# Altium footprint library hphonglib.PcbLib: 703 footprints (part 14 of 44)
Each footprint in its own frame and in the unit in brackets; x right, y up, seen from the top. Pads: shape width x height; smd on the part's side, far side on the other; paste and mask are expansions set on the pad; w line width, h text height; cw(c..) or ccw(c..) is an arc to the next point about the centre after c.
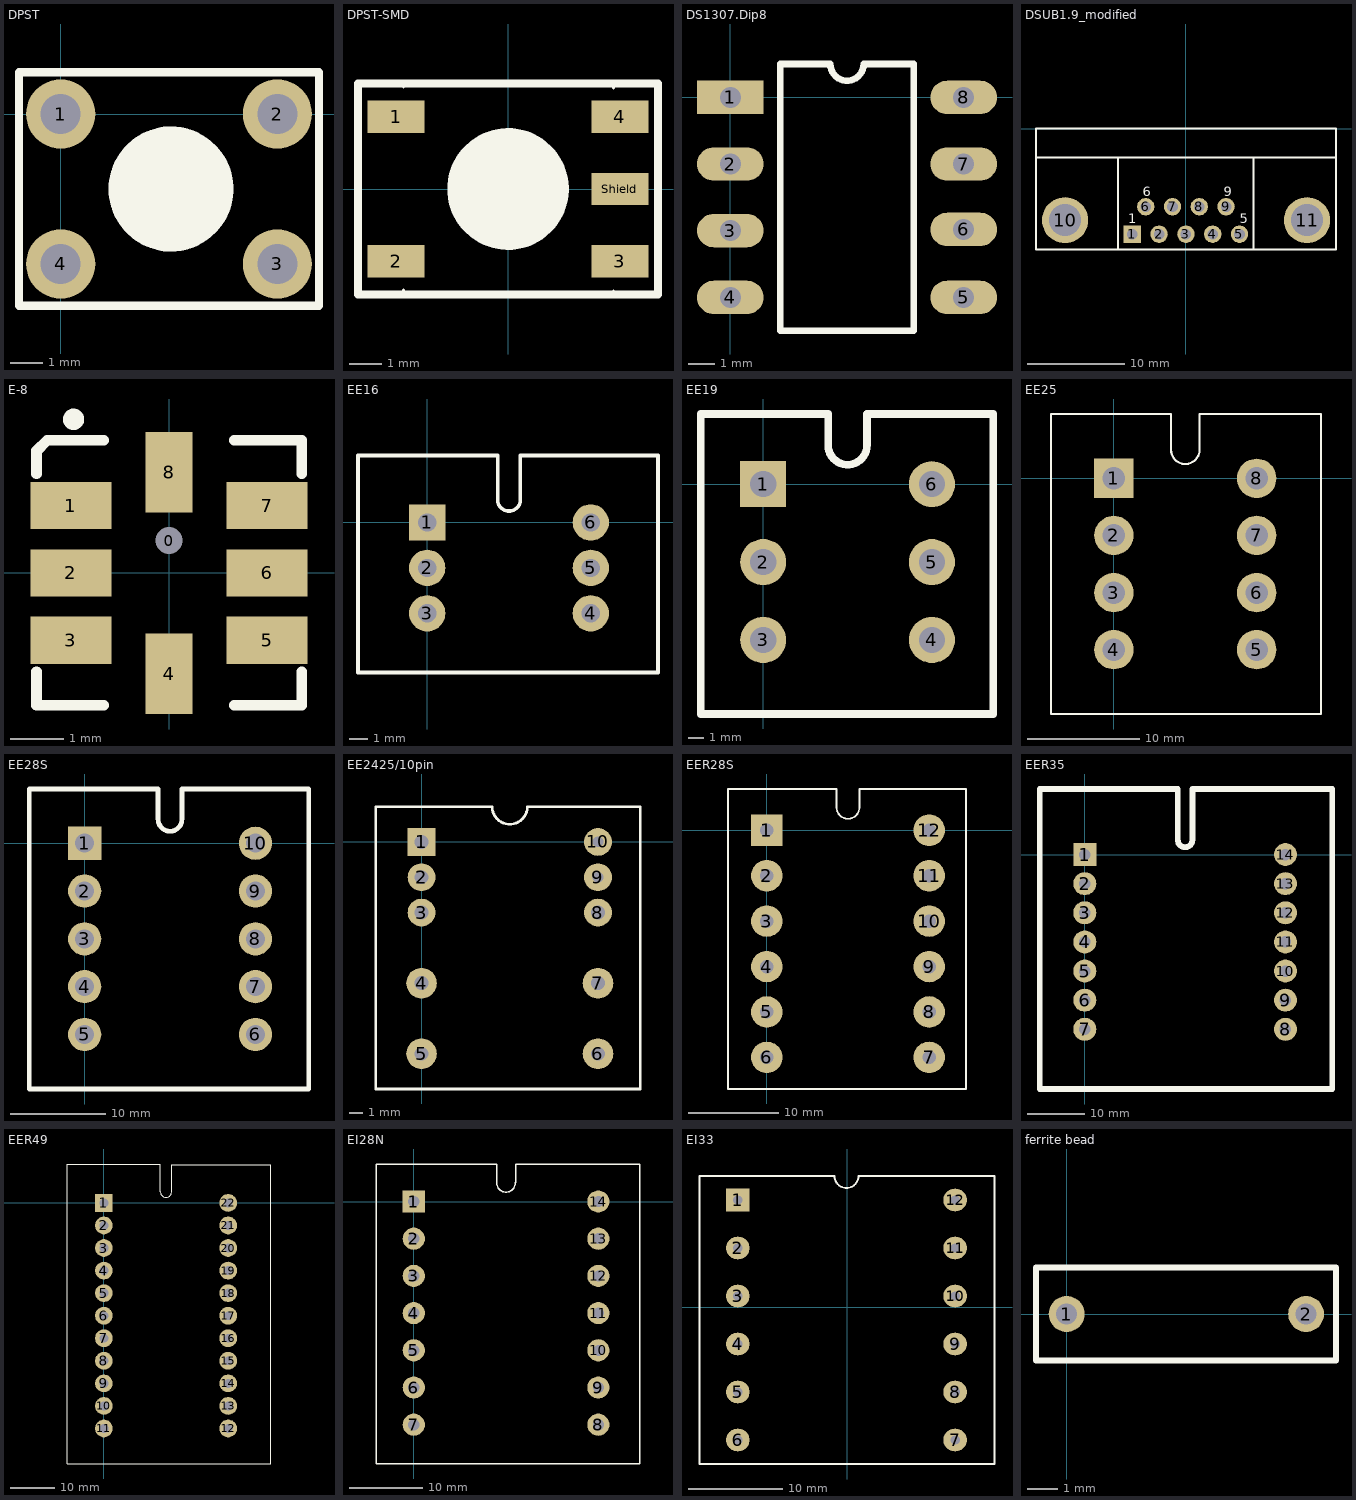
[diagram p13: the footprints below, top view; thin cyan lines are the x and y axes]

## DPST [mil] "Double-Pole, Single-Throw Switch; 4 Leads; Solder Pad 35mil"
pads (4):
  round 83 hole 48: 1(0,0) 2(260,0) 3(260,-180) 4(0,-180)
Top Overlay:
  circle w80: c132.5,-90 r35
  lines w10: -50,-230 310,-230 310,50 -50,50 -50,-230
3D body: height 275.59, standoff -137.8, extent -25.51,-212.04 285.52,32.06

## DPST-SMD [mil] "Double-Pole, Single-Throw Switch; 4 Leads; Solder Pad 35mil"
pads (5):
  rect 70x40 smd: 1(-138,89) 2(-138,-89) 3(138,-89) 4(138,89) Shield(138,0)
Top Overlay:
  circle w80: c0,0 r35
  lines w4: -129,-130 -129,-125 ; -129,126 -129,130 ; 130,-130 130,-126 ; 130,125 130,130
  lines w10: -185,-130 185,-130 185,130 -185,130 -185,-130
3D body: height 122.05, standoff 78.74, extent -59.32,-59.32 59.32,59.32
3D body: height 82.68, standoff 39.37, extent -135,-42 -122,41
3D body: height 23.62, standoff 15.75, extent -137,-104 -122,-73
3D body: height 23.62, standoff 0, extent -145,-104 -137,-73
3D body: height 7.87, standoff 0, extent -167,-104 -145,-73
3D body: height 23.62, standoff 15.75, extent -137,73 -122,104
3D body: height 23.62, standoff 0, extent -145,73 -137,104
3D body: height 7.87, standoff 0, extent -167,73 -145,104
3D body: height 23.62, standoff 15.75, extent 122,73 137,104
3D body: height 23.62, standoff 0, extent 137,73 145,104
3D body: height 7.87, standoff 0, extent 145,73 167,104
3D body: height 7.87, standoff 0, extent 145,-104 167,-73
3D body: height 23.62, standoff 0, extent 137,-104 145,-73
3D body: height 23.62, standoff 15.75, extent 122,-104 137,-73
3D body: height 7.87, standoff 0, extent 135,13 137,23
3D body: height 7.87, standoff 0, extent 135,-23 137,-11
3D body: height 7.87, standoff 0, extent 135,-11 167,13
3D body: height 82.68, standoff 0, extent 122,-41 135,42
3D body: height 82.68, standoff 78.74, extent -130,-130 130,130
3D body: height 78.74, standoff 3.94, extent -129.98,-129.98 129.98,129.98

## DS1307.Dip8 [mm] "Dual Inline Package 8 pins"
pads (8):
  rect 2.54x1.27 hole 0.8: 1(0,0)
  oval 2.54x1.27 hole 0.8: 2(0,-2.54) 3(0,-5.08) 4(0,-7.62) 5(8.89,-7.62) 6(8.89,-5.03) 7(8.89,-2.54) 8(8.89,0)
Top Overlay:
  lines w0.254: 1.905,-8.89 1.905,1.27 3.81,1.27 ccw(c4.445,1.27) 5.08,1.27 6.985,1.27 6.985,-8.89 1.905,-8.89
3D body: height 3, standoff 0.5, extent 0.03,-8.37 0.38,-6.87
3D body: height 0.5, standoff -3.8, extent 0.03,-7.895 0.38,-7.345
3D body: height 0.5, standoff -3.8, extent 8.42,-0.275 8.77,0.275
3D body: height 3, standoff 0.5, extent 8.42,-0.75 8.77,0.75
3D body: height 3, standoff 2.65, extent 6.895,-0.75 8.595,0.75
3D body: height 0.5, standoff -3.8, extent 8.42,-2.815 8.77,-2.265
3D body: height 3, standoff 0.5, extent 8.42,-3.29 8.77,-1.79
3D body: height 3, standoff 2.65, extent 6.895,-3.29 8.595,-1.79
3D body: height 0.5, standoff -3.8, extent 8.42,-5.355 8.77,-4.805
3D body: height 3, standoff 0.5, extent 8.42,-5.83 8.77,-4.33
3D body: height 3, standoff 2.65, extent 6.895,-5.83 8.595,-4.33
3D body: height 0.5, standoff -3.8, extent 0.03,-5.355 0.38,-4.805
3D body: height 3, standoff 0.5, extent 0.03,-5.83 0.38,-4.33
3D body: height 3, standoff 2.65, extent 0.205,-5.83 1.905,-4.33
3D body: height 0.5, standoff -3.8, extent 0.03,-2.815 0.38,-2.265
3D body: height 3, standoff 0.5, extent 0.03,-3.29 0.38,-1.79
3D body: height 3, standoff 2.65, extent 0.205,-3.29 1.905,-1.79
3D body: height 0.5, standoff -3.8, extent 0.03,-0.275 0.38,0.275
3D body: height 3, standoff 0.5, extent 0.03,-0.75 0.38,0.75
3D body: height 3, standoff 2.65, extent 0.205,-0.75 1.905,0.75
3D body: height 5.3, standoff 0.3, extent 1.905,-8.89 6.985,1.27
3D body: height 3, standoff 2.65, extent 0.205,-8.37 1.905,-6.87
3D body: height 3, standoff 2.65, extent 6.895,-8.37 8.595,-6.87
3D body: height 5.4, standoff 4, extent 3.441,0.261 5.458,1.27

## DSUB1.9_modified [mm] "7906 Series DSUB Right Angle Socket; Body Width, 30.81mm, 9 Positions"
pads (11):
  rect 1.8x1.8 hole 1.1: 1(-5.54,-10.92)
  round 1.8 hole 1.1: 2(-2.77,-10.92) 3(0,-10.92) 4(2.77,-10.92) 5(5.54,-10.92) 6(-4.155,-8.08) 7(-1.385,-8.08) 8(1.385,-8.08) 9(4.155,-8.08)
  round 4.76 hole 3.3: 10(-12.497,-9.474) 11(12.522,-9.474)
Top Overlay:
  lines w0.2: -15.4,-3 15.4,-3 ; -7,-12.4 -7,-3 ; 7,-12.4 7,-3 ; -15.5,-12.5 15.5,-12.5 15.5,0 -15.5,0 -15.5,-12.5
  text "6" at -4.445,-6.985 h1
  text "9" at 3.937,-6.985 h1
  text "5" at 5.588,-9.779 h1
  text "1" at -5.969,-9.779 h1
Bottom Overlay:
  circle w0.254: c-12.495,-9.5 r2.659
  circle w0.254: c12.495,-9.5 r2.659
  lines w0.254: -7.036,-12.522 -7.036,-3.023 -7.01,-3.023 ; 6.985,-12.522 6.985,-3.023 7.036,-3.023 ; 15.519,-3.023 15.519,-12.522 -15.469,-12.522 -15.469,-3.023 ; -15.469,-3.023 15.494,-3.023 15.494,0.025 -15.469,0.025 -15.469,-3.023
  text "1" at -5.715,-9.855 h1
  text "9" at 4.547,-7.01 h1
  text "5" at 6.172,-9.804 h1
  text "6" at -3.708,-7.036 h1
Mechanical 13:
  text ".Designator" at -4.216,-9.627 h2.03
3D body: height 12.55, standoff -3.5, extent -15.672,-12.575 15.642,6.225

## E-8 [mil]
pads (9):
  round 15 hole 20 unplated: 0(-0.02,23.98)
  rect 60x35 smd: 1(-72.85,49.98) 2(-72.85,-0.02) 3(-72.85,-50.02) 5(72.82,-50.02) 6(72.82,-0.02) 7(72.82,49.98)
  rect 35x60 smd: 4(-0.02,-74.82) 8(-0.02,74.79)
Top Overlay:
  circle w7.87: c-70.89,114.16 r3.94
  lines w7.87: -98.44,-73.44 -98.44,-98.44 -48.44,-98.44 ; -98.44,73.56 -98.44,90.69 ; -90.57,98.56 -48.44,98.56 ; 48.56,-98.44 98.56,-98.44 98.56,-73.44 ; 48.56,98.56 98.56,98.56 98.56,73.56
  lines w8: -98.44,90.69 -90.57,98.56
3D body: height 80, standoff 0, extent -95,-95 95,95

## EE16 [mm]
pads (6):
  rect 2x2 hole 1: 1(0,0)
  round 2 hole 1: 2(0,-2.5) 3(0,-5) 4(9,-5) 5(9,-2.5) 6(9,0)
Top Overlay:
  lines w0.2: -3.81,-8.255 12.7,-8.255 12.7,3.683 5.125,3.683 5.125,1.25 cw(c4.5,1.25) 3.875,1.25 3.875,3.683 -3.81,3.683 -3.81,-8.255

## EE19 [mm] "EE19 ferrit core"
pads (6):
  rect 3x3 hole 1.7: 1(0,0)
  round 3 hole 1.7: 2(0,-5.08) 3(0,-10.16) 4(11,-10.16) 5(11,-5.08) 6(11,0)
Top Overlay:
  lines w0.5: -4.064,-14.986 14.986,-14.986 14.986,4.572 6.77,4.572 6.77,2.54 cw(c5.5,2.54) 4.23,2.54 4.23,4.572 -4.064,4.572 -4.064,-14.986

## EE25 [mm] "Ferrit core"
pads (8):
  rect 3.5x3.5 hole 2: 1(0,0)
  round 3.5 hole 2: 2(0,-5.08) 3(0,-10.16) 4(0,-15.24) 5(12.7,-15.24) 6(12.7,-10.16) 7(12.7,-5.08) 8(12.7,0)
Top Overlay:
  lines w0.2: -5.588,-20.955 -5.588,5.715 5.08,5.715 5.08,2.54 ccw(c6.35,2.54) 7.62,2.54 7.62,5.715 18.415,5.715 18.415,-20.955 -5.588,-20.955

## EE28S [mm]
pads (10):
  rect 3.5x3.5 hole 2: 1(0,0)
  round 3.5 hole 2: 2(0,-5.04) 3(0,-10.08) 4(0,-15.12) 5(0,-20.16) 6(18,-20.16) 7(18,-15.12) 8(18,-10.08) 9(18,-5.04) 10(18,0)
Top Overlay:
  lines w0.5: -5.842,-25.908 23.622,-25.908 23.622,5.715 10.26,5.715 10.26,2.52 cw(c9,2.52) 7.74,2.52 7.74,5.715 -5.842,5.715 -5.842,-25.908

## EE2425/10pin [mm]
pads (10):
  rect 2x2 hole 1: 1(0,0)
  round 2 hole 1: 2(0,-2.54) 3(0,-5.08) 8(12.7,-5.08)
  round 2.2 / inner oval 2.2x1.2 / far side round 2.2 hole 1: 4(0,-10.16) 5(0,-15.24) 6(12.7,-15.24) 7(12.7,-10.16)
  round 2 hole 0.762: 9(12.7,-2.54) 10(12.7,0)
Top Overlay:
  lines w0.2: -3.302,-17.78 15.748,-17.78 15.748,2.54 7.62,2.54 cw(c6.35,2.54) 5.08,2.54 -3.302,2.54 -3.302,-17.78

## EER28S [mm] "Stand EER core"
pads (12):
  rect 3.5x3.5 hole 1.5: 1(0,0)
  round 3.5 hole 1.5: 2(0,-5.04) 3(0,-10.08) 4(0,-15.12) 5(0,-20.16) 6(0,-25.2) 7(18,-25.2) 8(18,-20.16) 9(18,-15.12) 10(18,-10.08) 11(18,-5.04) 12(18,0)
Top Overlay:
  lines w0.2: -4.318,-28.702 -4.318,4.572 7.74,4.572 7.74,2.52 ccw(c9,2.52) 10.26,2.52 10.26,4.572 22.098,4.572 22.098,-28.702 -4.318,-28.702

## EER35 [mm]
pads (14):
  rect 4x4 hole 2: 1(0,0)
  round 4 hole 2: 2(0,-5.08) 3(0,-10.16) 4(0,-15.24) 5(0,-20.32) 6(0,-25.4) 7(0,-30.48) 8(35,-30.48) 9(35,-25.4) 10(35,-20.32) 11(35,-15.24) 12(35,-10.16) 13(35,-5.08) 14(35,0)
Top Overlay:
  lines w1: -7.874,-40.894 43.18,-40.894 43.18,11.43 18.77,11.43 18.77,2.54 cw(c17.5,2.54) 16.23,2.54 16.23,11.43 -7.874,11.43 -7.874,-40.894

## EER49 [mm]
pads (22):
  rect 4x4 hole 2: 1(0,0)
  round 4 hole 2: 2(0,-5.08) 3(0,-10.16) 4(0,-15.24) 5(0,-20.32) 6(0,-25.4) 7(0,-30.48) 8(0,-35.56) 9(0,-40.64) 10(0,-45.72) 11(0,-50.8) 12(28,-50.8) 13(28,-45.72) 14(28,-40.64) 15(28,-35.56) 16(28,-30.48) 17(28,-25.4) 18(28,-20.32) 19(28,-15.24) 20(28,-10.16) 21(28,-5.08) 22(28,0)
Top Overlay:
  lines w0.2: -8.255,-58.801 37.592,-58.801 37.592,8.636 15.27,8.636 15.27,2.54 cw(c14,2.54) 12.73,2.54 12.73,8.763 -8.255,8.763 -8.255,-58.801

## EI28N [mm]
pads (14):
  rect 3x3 hole 1.5: 1(0,0)
  round 3 hole 1.5: 2(0,-5.04) 3(0,-10.08) 4(0,-15.12) 5(0,-20.16) 6(0,-25.2) 7(0,-30.24) 8(25,-30.24) 9(25,-25.2) 10(25,-20.16) 11(25,-15.12) 12(25,-10.08) 13(25,-5.04) 14(25,0)
Top Overlay:
  lines w0.2: -5.08,-35.56 -5.08,5.08 11.24,5.08 11.24,2.52 ccw(c12.5,2.52) 13.76,2.52 13.843,2.603 13.843,5.08 30.607,5.08 30.607,-35.56 -5.08,-35.56

## EI33 [mm] "EI33 ferrit core"
pads (12):
  rect 2.5x2.4 / inner rect 2.5x1.2 / far side rect 2.5x2.4 hole 1: 1(-11.582,11.328)
  oval 2.5x2.4 / inner oval 2.5x1.2 / far side oval 2.5x2.4 hole 1: 2(-11.582,6.248) 3(-11.582,1.168) 4(-11.582,-3.912) 5(-11.582,-8.992) 6(-11.582,-14.072) 7(11.418,-14.072) 8(11.418,-8.992) 9(11.418,-3.912) 10(11.418,1.168) 11(11.418,6.248) 12(11.418,11.328)
Top Overlay:
  lines w0.2: -15.646,-16.612 15.596,-16.612 15.596,13.868 1.188,13.868 cw(c-0.082,13.868) -1.352,13.868 -15.646,13.868 -15.646,-16.612
3D body: height 25.5, standoff -4, extent -16.797,-20.377 17.203,20.123

## ferrite bead [mm] "Res 8mm*2mm"
pads (2):
  round 1.2 hole 0.7: 1(0,0) 2(8,0)
Top Overlay:
  lines w0.2: -1.025,-1.55 -1.025,1.55 9,1.55 9,-1.55 -1.025,-1.55
Bottom Overlay:
  lines w0.254: -1.025,-1.55 8.975,-1.55 8.975,1.55 -1.025,1.55 -1.025,-1.55
3D body: height 2.3, standoff 1.7, extent 0.1,-0.3 1.6,0.299
3D body: height 2.3, standoff 1.7, extent 6.6,-0.3 8.1,0.299
3D body: height 2.1, standoff -1, extent 7.701,-0.3 8.299,0.299
3D body: height 2.1, standoff -1, extent -0.299,-0.3 0.299,0.299
3D body: height 3.29, standoff 0.7, extent 1.59,-1.272 6.59,1.322